# Altium footprint library SMT.PcbLib: 379 footprints (part 21 of 24)
Each footprint in its own frame and in the unit in brackets; x right, y up, seen from the top. Pads: shape width x height; smd on the part's side, far side on the other; paste and mask are expansions set on the pad; w line width, h text height; cw(c..) or ccw(c..) is an arc to the next point about the centre after c.
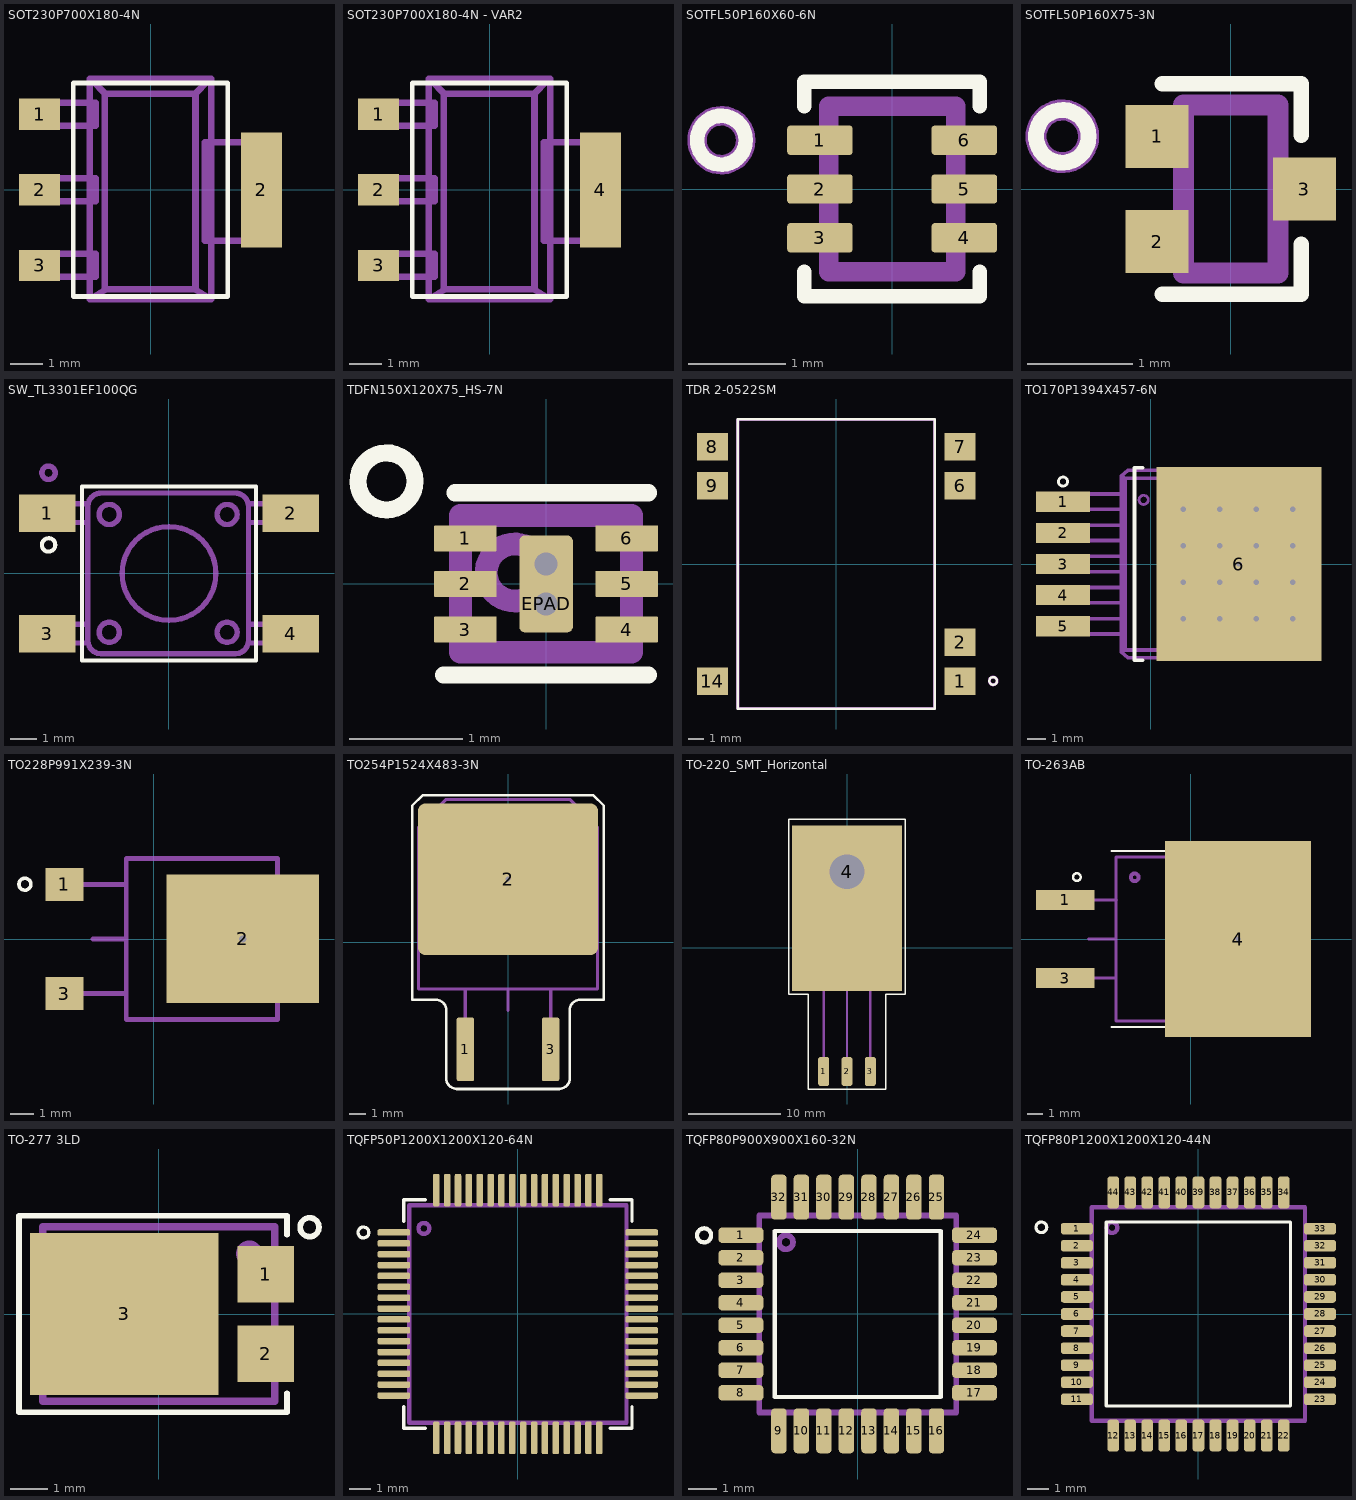
[diagram p20: the footprints below, top view; thin cyan lines are the x and y axes]

## SOT230P700X180-4N [mm] "SOT223, 4-Leads, Body 6,5x7,0mm (max), Pitch 2,30mm, IPC Medium Density"
height 1.8
pads (4):
  rect 1.25x0.95 smd: 1(-3.375,2.3) 2(-3.375,0) 3(-3.375,-2.3)
  rect 1.25x3.5 smd: 2(3.375,0)
Top Overlay:
  lines w0.15: -2.35,-3.25 2.35,-3.25 2.35,3.25 -2.35,3.25 -2.35,-3.25
Mechanical 1:
  lines w0.2: -1.758,3.301 -1.385,2.928 ; -1.35,-3.025 -1.85,-3.325 ; 1.35,-3.025 1.85,-3.325 ; 1.742,3.301 1.369,2.928 ; -1.85,-3.325 1.85,-3.325 ; -1.85,-3.325 -1.85,3.375 1.85,3.375 1.85,-3.325 ; -1.385,2.928 1.369,2.928 ; -1.385,2.928 -1.385,-3.026 1.369,-3.026 1.369,2.928 ; -3.61,-2.649 -3.104,-2.649 -2.812,-2.649 -2.782,-2.649 -2.421,-2.649 -1.672,-2.649 -1.672,-1.949 -2.421,-1.949 -2.782,-1.949 -2.812,-1.949 -3.104,-1.949 -3.61,-1.949 -3.61,-2.649 ; -3.61,-0.349 -3.104,-0.349 -2.812,-0.349 -2.782,-0.349 -2.421,-0.349 -1.672,-0.349 -1.672,0.351 -2.421,0.351 -2.782,0.351 -2.812,0.351 -3.104,0.351 -3.61,0.351 -3.61,-0.349 ; -3.61,1.951 -3.104,1.951 -2.812,1.951 -2.782,1.951 -2.421,1.951 -1.672,1.951 -1.672,2.651 -2.421,2.651 -2.782,2.651 -2.812,2.651 -3.104,2.651 -3.61,2.651 -3.61,1.951 ; 1.656,-1.549 1.656,1.451 2.404,1.451 2.766,1.451 2.796,1.451 3.088,1.451 3.594,1.451 3.594,-1.549 3.088,-1.549 2.796,-1.549 2.766,-1.549 2.404,-1.549 1.656,-1.549
Mechanical 20:
  text "Требуется прошивка, см.pdf" at -8.7,-5.2 h1.8
3D body "User Library-SOT-223-2.STEP": height 1.9, standoff 0, extent -3.61,-3.424 3.594,3.276

## SOT230P700X180-4N - VAR2 [mm] "SOT223, 4-Leads, Body 6,5x7,0mm (max), Pitch 2,30mm, IPC Medium Density"
height 1.8
pads (4):
  rect 1.25x0.95 smd: 1(-3.375,2.3) 2(-3.375,0) 3(-3.375,-2.3)
  rect 1.25x3.5 smd: 4(3.375,0)
Top Overlay:
  lines w0.15: -2.35,-3.25 2.35,-3.25 2.35,3.25 -2.35,3.25 -2.35,-3.25
Mechanical 1:
  lines w0.2: -1.758,3.301 -1.385,2.928 ; -1.35,-3.025 -1.85,-3.325 ; 1.35,-3.025 1.85,-3.325 ; 1.742,3.301 1.369,2.928 ; -1.85,-3.325 -1.85,3.375 1.85,3.375 1.85,-3.325 ; -1.85,-3.325 1.85,-3.325 ; -1.385,2.928 -1.385,-3.026 1.369,-3.026 1.369,2.928 ; -1.385,2.928 1.369,2.928 ; -3.61,-2.649 -3.61,-1.949 -3.104,-1.949 -2.812,-1.949 -2.782,-1.949 -2.421,-1.949 -1.672,-1.949 -1.672,-2.649 -2.421,-2.649 -2.782,-2.649 -2.812,-2.649 -3.104,-2.649 -3.61,-2.649 ; -3.61,-0.349 -3.61,0.351 -3.104,0.351 -2.812,0.351 -2.782,0.351 -2.421,0.351 -1.672,0.351 -1.672,-0.349 -2.421,-0.349 -2.782,-0.349 -2.812,-0.349 -3.104,-0.349 -3.61,-0.349 ; -3.61,1.951 -3.61,2.651 -3.104,2.651 -2.812,2.651 -2.782,2.651 -2.421,2.651 -1.672,2.651 -1.672,1.951 -2.421,1.951 -2.782,1.951 -2.812,1.951 -3.104,1.951 -3.61,1.951 ; 1.656,-1.549 2.404,-1.549 2.766,-1.549 2.796,-1.549 3.088,-1.549 3.594,-1.549 3.594,1.451 3.088,1.451 2.796,1.451 2.766,1.451 2.404,1.451 1.656,1.451 1.656,-1.549
Mechanical 20:
  text "Требуется прошивка, см.pdf" at -8.7,-5.2 h1.8
3D body "User Library-SOT-223-2.STEP": height 1.9, standoff 0, extent -3.61,-3.424 3.594,3.276

## SOTFL50P160X60-6N [mm] "SOTFL, 6-Leads, Body 1,60x1,60mm, Pitch 0,50mm, IPC Medium Density"
height 0.6
pads (6):
  rrect20% 0.67x0.3 smd paste+0 mask+0.05: 1(-0.74,0.5) 2(-0.74,0) 3(-0.74,-0.5) 4(0.74,-0.5) 5(0.74,0) 6(0.74,0.5)
Top Overlay:
  circle w0.15: c-1.75,0.5 r0.25
  lines w0.15: -0.9,-0.85 -0.9,-1.1 0.9,-1.1 0.9,-0.85 ; -0.9,0.85 -0.9,1.1 0.9,1.1 0.9,0.85
Mechanical 1:
  circle w0.2: c-1.75,0.5 r0.25
  lines w0.2: -0.65,-0.85 -0.65,0.85 0.65,0.85 0.65,-0.85 -0.65,-0.85
3D body "SOTFL50P160X60-6N.step": height 0.6, standoff 0, extent -0.8,-0.848 0.8,0.848

## SOTFL50P160X75-3N [mm] "SSMini3-F1, 3-Leads, Body 1.6x0.85mm, Pitch 0.5mm, IPC Medium Density"
height 0.75
pads (3):
  rect 0.6x0.6 smd: 1(-0.7,0.5) 2(-0.7,-0.5) 3(0.7,0)
Top Overlay:
  circle w0.15: c-1.6,0.5 r0.25
  lines w0.15: -0.65,-1 0.67,-1 0.67,-0.527 ; -0.65,1 0.67,1 0.67,0.513
Mechanical 1:
  circle w0.2: c-1.6,0.5 r0.25
  lines w0.2: -0.45,-0.8 0.45,-0.8 0.45,0.8 -0.45,0.8 -0.45,-0.8
3D body "User Library-FDY102PZ.STEP": height 0.78, standoff 0, extent -0.85,-0.85 0.85,0.85

## SW_TL3301EF100QG [mm] "SMT_TL3301EF100QG 6x6x7.3mm"
height 7.3
pads (4):
  rect 2.1x1.4 smd: 1(-4.55,2.25) 2(4.55,2.25) 3(-4.55,-2.25) 4(4.55,-2.25)
Top Overlay:
  circle w0.15: c-4.496,1.067 r0.25
  lines w0.15: -3.25,-3.25 -3.25,3.25 3.25,3.25 3.25,-3.25 -3.25,-3.25
Mechanical 1:
  circle w0.2: c-4.496,3.759 r0.25
  circle w0.2: c0,0 r1.75
  lines w0.2: -3.031,-1.895 -3.423,-1.895 -3.726,-1.895 -4.188,-1.895 -4.231,-1.895 -5.031,-1.895 -5.031,-2.595 -4.231,-2.595 -4.188,-2.595 -3.726,-2.595 -3.423,-2.595 -3.021,-2.595 ; -3.031,1.905 -3.423,1.905 -3.726,1.905 -4.188,1.905 -4.231,1.905 -5.031,1.905 -5.031,2.605 -4.231,2.605 -4.188,2.605 -3.726,2.605 -3.423,2.605 -3.021,2.605 ; 2.959,-2.595 3.361,-2.595 3.664,-2.595 4.126,-2.595 4.169,-2.595 4.969,-2.595 4.969,-1.895 4.169,-1.895 4.126,-1.895 3.664,-1.895 3.361,-1.895 2.969,-1.895 ; 2.959,2.605 3.361,2.605 3.664,2.605 4.126,2.605 4.169,2.605 4.969,2.605 4.969,1.905 4.169,1.905 4.126,1.905 3.664,1.905 3.361,1.905 2.969,1.905 ; -3.031,-2.495 ccw(c-2.531,-2.495) -2.531,-2.995 2.469,-2.995 ccw(c2.469,-2.495) 2.969,-2.495 2.969,2.505 ccw(c2.469,2.505) 2.469,3.005 -2.531,3.005 ccw(c-2.531,2.505) -3.031,2.505 -3.031,-2.495 ; -2.606,-2.195 cw(c-2.231,-2.195) -1.856,-2.195 cw(c-2.231,-2.195) -2.606,-2.195 ; -2.606,2.205 ccw(c-2.231,2.205) -1.856,2.205 ccw(c-2.231,2.205) -2.606,2.205 ; 1.794,-2.195 ccw(c2.169,-2.195) 2.544,-2.195 ccw(c2.169,-2.195) 1.794,-2.195 ; 1.794,2.205 cw(c2.169,2.205) 2.544,2.205 cw(c2.169,2.205) 1.794,2.205
3D body "TL3301SPFxxxxG.stp": height 7.6, standoff 0, extent -5,-3 5,3

## TDFN150X120X75_HS-7N [mm] "6-Leads, Body 1.5X1.2 mm Pitch 0.4 mm, Thermal Pad 0.52X0.85 mm IPC Medium Density"
height 0.8
pads (7):
  rrect9% 0.55x0.23 smd paste+0 mask+0.04: 1(-0.708,0.4) 2(-0.708,0) 3(-0.708,-0.4) 4(0.708,-0.4) 5(0.708,0) 6(0.708,0.4)
  rrect20% 0.47x0.85 hole 0.2 copper offset 0,0.175 mask+0.04: EPAD(0,-0.175)
via 0,0.175 diameter 0.45 hole 0.2
Top Overlay:
  lines w0.15: -1.15,0.9 cw(c-1.4,0.9) -1.15,0.908 ; -0.9,-0.8 0.9,-0.8 ; -0.8,0.8 0.9,0.8
Top Paste:
  region: -0.155,-0.345 -0.155,0.345 0.155,0.345 0.155,-0.345
Mechanical 1:
  circle w0.2: c-0.275,0.1 r0.25
  lines w0.2: -0.75,-0.6 -0.75,0.6 0.75,0.6 0.75,-0.6 -0.75,-0.6
Mechanical 20:
  text "Требуется прошивка / см.datasheet, отв.plugged" at -2.5,-1.7 h1
3D body "МААМ-011101.stp": height 0.75, standoff -0.02, extent -0.75,-0.6 0.75,0.6

## TDR 2-0522SM [mm]
height 8.7
pads (7):
  rect 2x1.8 smd: 1(8.05,-7.62) 2(8.05,-5.08) 6(8.05,5.08) 7(8.05,7.62) 8(-8.05,7.62) 9(-8.05,5.08) 14(-8.05,-7.62)
Top Overlay:
  circle w0.15: c10.2,-7.6 r0.25
  lines w0.15: -6.4,-9.4 6.4,-9.4 6.4,9.4 -6.4,9.4 -6.4,-9.4
Mechanical 1:
  circle w0.2: c10.2,-7.6 r0.25
  lines w0.2: -6.4,-9.4 -6.4,9.4 6.4,9.4 6.4,-9.4 -6.4,-9.4
3D body "TDR 2.stp": height 8.96, standoff 0.01, extent -8.6,-9.42 8.6,9.42

## TO170P1394X457-6N [mm] "D2-PAK, 6-Pads, Body 7,04x8,63mm (max), IPC Medium Density"
height 4.57
pads (6):
  rect 2.95x1.1 smd: 1(-4.8,3.4) 2(-4.8,1.7) 3(-4.8,0) 4(-4.8,-1.7) 5(-4.8,-3.4)
  rect 9x10.6 hole 0.3 paste+9: 6(4.8,0)
via 5.75,3 diameter 0.8 hole 0.3
via 3.75,3 diameter 0.8 hole 0.3
via 1.75,3 diameter 0.8 hole 0.3
via 1.75,1 diameter 0.8 hole 0.3
via 3.75,1 diameter 0.8 hole 0.3
via 5.75,1 diameter 0.8 hole 0.3
via 7.75,3 diameter 0.8 hole 0.3
via 7.75,1 diameter 0.8 hole 0.3
via 1.75,-1 diameter 0.8 hole 0.3
via 3.75,-1 diameter 0.8 hole 0.3
via 5.75,-1 diameter 0.8 hole 0.3
via 7.75,-1 diameter 0.8 hole 0.3
via 7.75,-3 diameter 0.8 hole 0.3
via 5.75,-3 diameter 0.8 hole 0.3
via 3.75,-3 diameter 0.8 hole 0.3
via 1.75,-3 diameter 0.8 hole 0.3
Top Overlay:
  circle w0.15: c-4.8,4.5 r0.25
  lines w0.2: -0.45,-5.25 -0.9,-5.25 -0.9,5.25 -0.45,5.25
Top Paste:
  region: 8.393,3.663 7.093,3.663 7.093,2.363 8.393,2.363
  region: 8.393,1.663 7.093,1.663 7.093,0.363 8.393,0.363
  region: 8.393,-0.337 7.093,-0.337 7.093,-1.637 8.393,-1.637
  region: 8.393,-2.337 7.093,-2.337 7.093,-3.637 8.393,-3.637
  region: 6.393,3.663 5.093,3.663 5.093,2.363 6.393,2.363
  region: 6.393,1.663 5.093,1.663 5.093,0.363 6.393,0.363
  region: 6.393,-0.337 5.093,-0.337 5.093,-1.637 6.393,-1.637
  region: 6.393,-2.337 5.093,-2.337 5.093,-3.637 6.393,-3.637
  region: 4.393,-2.337 3.093,-2.337 3.093,-3.637 4.393,-3.637
  region: 4.393,-0.337 3.093,-0.337 3.093,-1.637 4.393,-1.637
  region: 4.393,1.663 3.093,1.663 3.093,0.363 4.393,0.363
  region: 4.393,3.663 3.093,3.663 3.093,2.363 4.393,2.363
  region: 2.393,3.663 1.093,3.663 1.093,2.363 2.393,2.363
  region: 2.393,1.663 1.093,1.663 1.093,0.363 2.393,0.363
  region: 2.393,-0.337 1.093,-0.337 1.093,-1.637 2.393,-1.637
  region: 2.393,-2.337 1.093,-2.337 1.093,-3.637 2.393,-3.637
Mechanical 1:
  circle w0.15: c-0.4,3.5 r0.25
  lines w0.2: -1.617,-4.812 -1.418,-4.691 ; -1.617,-4.812 -1.617,-3.824 ; -1.617,-4.812 -1.261,-5.113 7.273,-5.113 ; -1.617,-3.824 -1.617,-2.986 ; -1.617,-3.824 -2.462,-3.824 -3.572,-3.824 -3.63,-3.824 -4.284,-3.824 -5.554,-3.824 -5.554,-2.986 -4.284,-2.986 -3.63,-2.986 -3.572,-2.986 -2.462,-2.986 -1.617,-2.986 ; -1.617,-2.986 -1.617,-2.122 ; -1.617,-2.122 -2.462,-2.122 -3.572,-2.122 -3.63,-2.122 -4.284,-2.122 -5.554,-2.122 -5.554,-1.284 -4.284,-1.284 -3.63,-1.284 -3.572,-1.284 -2.462,-1.284 -1.617,-1.284 ; -1.617,-2.122 -1.617,-1.284 ; -1.617,-1.284 -1.617,-0.42 ; -1.617,-0.42 -2.462,-0.42 -3.572,-0.42 -3.63,-0.42 -4.284,-0.42 -5.554,-0.42 -5.554,0.418 -4.284,0.418 -3.63,0.418 -3.572,0.418 -2.462,0.418 -1.617,0.418 ; -1.617,-0.42 -1.617,0.418 ; -1.617,0.418 -1.617,1.282 ; -1.617,1.282 -2.462,1.282 -3.572,1.282 -3.63,1.282 -4.284,1.282 -5.554,1.282 -5.554,2.12 -4.284,2.12 -3.63,2.12 -3.572,2.12 -2.462,2.12 -1.617,2.12 ; -1.617,1.282 -1.617,2.12 ; -1.617,2.12 -1.617,2.984 ; -1.617,2.984 -1.617,3.822 ; -1.617,2.984 -2.462,2.984 -3.572,2.984 -3.63,2.984 -4.284,2.984 -5.554,2.984 -5.554,3.822 -4.284,3.822 -3.63,3.822 -3.572,3.822 -2.462,3.822 -1.617,3.822 ; -1.617,3.822 -1.617,4.81 ; -1.617,4.81 -1.261,5.111 7.273,5.111 ; -1.617,4.81 -1.418,4.689 ; -1.418,-4.691 -1.418,4.689 ; -1.418,-4.691 6.919,-4.691 ; -1.418,4.689 6.919,4.689 ; 6.919,-4.691 6.919,4.689 ; 6.919,-4.691 7.273,-4.99 7.273,-3.252 ; 6.919,4.689 7.273,4.989 7.273,3.25 ; 7.273,-5.113 8.299,-5.113 8.797,-3.252 8.797,3.25 8.299,5.111 7.273,5.111 ; 7.273,-5.113 7.273,-3.252 ; 7.273,-3.252 7.273,3.25 ; 7.273,3.25 7.273,5.111
Mechanical 15:
  lines w0.1: 0.95,0 1.95,0 ; 1.45,-0.5 1.45,0.5
3D body "SW3dPS-LTC DD-PAK.STEP": height 4.4, standoff -0.09, extent -5.882,-5.112 8.469,5.112

## TO228P991X239-3N [mm] "D-PAK, 3-Pads, Body 9.905x6,605mm (max), IPC Medium Density"
height 2.38
pads (3):
  rect 1.6x1.4 smd: 1(-3.746,2.29) 3(-3.746,-2.29)
  rect 6.4x5.4 hole 0.3: 2(3.747,0.004)
Top Overlay:
  circle w0.15: c-5.4,2.3 r0.25
Top Paste:
  region: 5.447,-1.196 5.447,1.204 2.047,1.204 2.047,-1.196
Mechanical 1:
  lines w0.2: -3.683,-2.286 -1.146,-2.286 ; -3.683,2.286 -1.143,2.286 ; -2.54,0 -1.146,0 ; 5.204,-2.25 5.5,-2.25 6,-1.75 6,1.75 5.5,2.25 5.204,2.25 ; -1.146,-3.375 5.204,-3.375 5.204,3.375 -1.146,3.375 -1.146,-3.375
3D body "SW3dPS-DPAK-1.STEP": height 2.41, standoff 0, extent -4.033,-3.27 5.906,3.27

## TO254P1524X483-3N [mm] "SMD; Pitch: 2.54mm; Body: L=14.7 мм, W=10,2 мм, H=4.6 мм"
height 4.572
pads (3):
  rrect25% 1.05x3.8 smd: 1(-2.54,-6.4) 3(2.54,-6.4)
  rrect10% 10.75x9.05 hole 0.3: 2(0,3.75)
Top Overlay:
  lines w0.15: -5.715,-3.429 -4.318,-3.429 cw(c-4.318,-4.064) -3.683,-4.064 -3.683,-8.128 ccw(c-3.048,-8.128) -3.048,-8.763 3.048,-8.763 ccw(c3.048,-8.128) 3.683,-8.128 3.683,-4.064 cw(c4.318,-4.064) 4.318,-3.429 5.715,-3.429 5.715,8.128 5.08,8.763 -5.08,8.763 -5.715,8.128 -5.715,-3.429
Top Paste:
  rectangle: -2.8,1.8 2.9,5.7
Mechanical 1:
  lines w0.2: -2.54,-7.375 -2.54,-2.803 ; 0,-4.073 0,-2.803 ; 2.54,-7.375 2.54,-2.803 ; -5.334,6.849 -3.683,8.5 ; -5.334,6.849 -5.334,-2.803 5.334,-2.803 5.334,6.849 ; -5.334,6.849 5.334,6.849 ; -3.683,8.5 3.683,8.5 ; -3.683,8.5 3.683,8.5 ; 3.683,8.5 5.334,6.849
3D body "D2PAK.STEP": height 4.9, standoff -0.12, extent -5.08,-7.112 5.08,8.152

## TO-220_SMT_Horizontal [mm] "Transistor outline, TO-220, SMT, требуеться прошивка. Формовку выводов см. приспособление ЛБИЮ.7803-0021-000 СБ"
height 4.7
pads (4):
  rrect50% 1.2x3.2 smd: 1(-2.54,-13.462) 2(0,-13.462) 3(2.54,-13.462)
  rect 12x18 hole 3.8 copper offset 0,-3.986: 4(0,8.255)
Top Overlay:
  lines w0.15: -6.35,-5.08 -4.191,-5.08 -4.191,-15.367 4.191,-15.367 4.191,-5.08 6.35,-5.08 6.35,13.97 -6.35,13.97 -6.35,-5.08
Mechanical 1:
  circle w0.2: c0,8.259 r1.9
  lines w0.025: -2.413,8.259 2.413,8.259 ; 0,-4.953 0,12.573
  lines w0.25: -5.334,4.445 5.334,4.445 ; -2.54,-14.478 -2.54,-4.445 ; 0,-14.478 0,-4.445 ; 2.54,-14.478 2.54,-4.445 ; -5.334,-4.445 5.334,-4.445 5.334,11.049 -5.334,11.049 -5.334,-4.445
3D body "TO-220_SMT_Horizontal.STEP": height 4.7, standoff 0, extent -5.27,-14.54 5.27,11.045

## TO-263AB [mm] "D2-PAK, 3-Pads, Body 9.65x10.67mm (max), IPC Medium Density"
height 4.83
pads (3):
  rect 3.8x1.3 smd paste-0.1 mask+0.05: 1(-8.125,2.54) 3(-8.125,-2.54)
  rect 9.45x12.7 hole 0.3 paste-10: 4(3.075,0)
Top Overlay:
  circle w0.15: c-7.375,4.015 r0.25
  lines w0.15: -5.125,-5.7 7.675,-5.7 7.675,5.7 -5.125,5.7
Top Paste:
  rectangle: -0.175,-3.25 2.575,-0.5
  region: 6.325,-0.5 3.575,-0.5 3.575,-3.25 6.325,-3.25
  region: 6.325,3.25 3.575,3.25 3.575,0.5 6.325,0.5
  rectangle: -0.175,0.5 2.575,3.25
Mechanical 1:
  circle w0.25: c-3.625,4 r0.25
  lines w0.2: -9.375,-2.54 -4.825,-2.54 ; -9.358,2.54 -4.808,2.54 ; -6.605,0 -4.825,0 ; 4.825,-5.325 6.105,-5.325 6.505,-4.925 6.505,4.925 6.105,5.325 4.825,5.325 ; 4.825,-5.325 -4.825,-5.325 -4.825,5.325 4.825,5.325 ; 4.825,-5.325 4.825,5.325
3D body "DPAK254P1525X483-3N.step": height 5.23, standoff 0, extent -8.705,-5.325 6.54,5.325

## TO-277 3LD [mm] "TO-277 3LD, 4.63x6.15 (max), 3 lead"
height 1.2
pads (3):
  rect 1.5x1.5 smd: 1(2.837,1.05) 2(2.837,-1.05)
  rect 5x4.3 smd paste-10: 3(-0.913,0)
Top Overlay:
  circle w0.15: c4,2.3 r0.25
  lines w0.15: -3.7,-1.5 -3.7,2.6 3.4,2.6 3.4,2.1 ; -3.7,-1.4 -3.7,-2.6 3.4,-2.6 3.4,-2.1
Top Paste:
  region: -2.7,1.5 0.9,1.5 0.9,-1.5 -2.7,-1.5
Mechanical 1:
  circle w0.2: c2.4,1.6 r0.25
  lines w0.2: -3.075,-2.315 3.075,-2.315 3.075,2.315 -3.075,2.315 -3.075,-2.315
3D body "TO-277.stp": height 1.2, standoff -0.01, extent -3.3,-2.175 3.35,2.175

## TQFP50P1200X1200X120-64N [mm] "TSQFP, 64-Leads, Body 10,00x10,00mm, Pitch 0,50mm, IPC Medium Density"
height 1.2
pads (64):
  rrect50% 1.5x0.3 smd mask+0.03: 1(-5.7,3.75) 2(-5.7,3.25) 3(-5.7,2.75) 4(-5.7,2.25) 5(-5.7,1.75) 6(-5.7,1.25) 7(-5.7,0.75) 8(-5.7,0.25) 9(-5.7,-0.25) 10(-5.7,-0.75) 11(-5.7,-1.25) 12(-5.7,-1.75) 13(-5.7,-2.25) 14(-5.7,-2.75) 15(-5.7,-3.25) 16(-5.7,-3.75) 33(5.7,-3.75) 34(5.7,-3.25) 35(5.7,-2.75) 36(5.7,-2.25) 37(5.7,-1.75) 38(5.7,-1.25) 39(5.7,-0.75) 40(5.7,-0.25) 41(5.7,0.25) 42(5.7,0.75) 43(5.7,1.25) 44(5.7,1.75) 45(5.7,2.25) 46(5.7,2.75) 47(5.7,3.25) 48(5.7,3.75)
  rrect50% 0.3x1.5 smd mask+0.03: 17(-3.75,-5.7) 18(-3.25,-5.7) 19(-2.75,-5.7) 20(-2.25,-5.7) 21(-1.75,-5.7) 22(-1.25,-5.7) 23(-0.75,-5.7) 24(-0.25,-5.7) 25(0.25,-5.7) 26(0.75,-5.7) 27(1.25,-5.7) 28(1.75,-5.7) 29(2.25,-5.7) 30(2.75,-5.7) 31(3.25,-5.7) 32(3.75,-5.7) 49(3.75,5.7) 50(3.25,5.7) 51(2.75,5.7) 52(2.25,5.7) 53(1.75,5.7) 54(1.25,5.7) 55(0.75,5.7) 56(0.25,5.7) 57(-0.25,5.7) 58(-0.75,5.7) 59(-1.25,5.7) 60(-1.75,5.7) 61(-2.25,5.7) 62(-2.75,5.7) 63(-3.25,5.7) 64(-3.75,5.7)
Top Overlay:
  circle w0.15: c-7.1,3.75 r0.25
  lines w0.15: -5.25,-4.25 -5.25,-5.25 -4.25,-5.25 ; -5.25,4.25 -5.25,5.25 -4.25,5.25 ; 4.25,-5.25 5.25,-5.25 5.25,-4.25 ; 4.25,5.25 5.25,5.25 5.25,4.25
Mechanical 1:
  circle w0.2: c-4.318,3.937 r0.25
  lines w0.2: -5,-5 5,-5 5,5 -5,5 -5,-5
3D body "User Library-VQFP-64.STEP": height 1.22, standoff 0, extent -5.999,-6 6,5.999

## TQFP80P900X900X160-32N [mm] "TQFP, 32-Leads, Body 7,00x7,00mm, Pitch 0,80mm, IPC Medium Density"
height 1.6
pads (32):
  rrect50% 1.6x0.55 smd mask+0.03: 1(-4.15,2.8) 2(-4.15,2) 3(-4.15,1.2) 4(-4.15,0.4) 5(-4.15,-0.4) 6(-4.15,-1.2) 7(-4.15,-2) 8(-4.15,-2.8) 17(4.15,-2.8) 18(4.15,-2) 19(4.15,-1.2) 20(4.15,-0.4) 21(4.15,0.4) 22(4.15,1.2) 23(4.15,2) 24(4.15,2.8)
  rrect50% 0.55x1.6 smd mask+0.03: 9(-2.8,-4.15) 10(-2,-4.15) 11(-1.2,-4.15) 12(-0.4,-4.15) 13(0.4,-4.15) 14(1.2,-4.15) 15(2,-4.15) 16(2.8,-4.15) 25(2.8,4.15) 26(2,4.15) 27(1.2,4.15) 28(0.4,4.15) 29(-0.4,4.15) 30(-1.2,4.15) 31(-2,4.15) 32(-2.8,4.15)
Top Overlay:
  circle w0.15: c-5.461,2.794 r0.25
  lines w0.15: -2.95,-2.95 2.95,-2.95 2.95,2.95 -2.95,2.95 -2.95,-2.95
Mechanical 1:
  circle w0.2: c-2.55,2.55 r0.25
  lines w0.2: -3.5,-3.5 3.5,-3.5 3.5,3.5 -3.5,3.5 -3.5,-3.5
Mechanical 3:
  circle w0.2: c-2.55,2.55 r0.25
  lines w0.2: -3.5,-3.5 -3.5,3.5 3.5,3.5 3.5,-3.5 -3.5,-3.5
3D body "TQFP80P900X900-32.STEP": height 1.21, standoff 0.01, extent -4.5,-4.5 4.5,4.5

## TQFP80P1200X1200X120-44N [mm] "TQFP, 44-Leads, Body 10,00x10,00mm, Pitch 0,80mm, IPC Medium Density"
height 1.2
pads (44):
  rrect50% 1.5x0.55 smd mask+0.03: 1(-5.7,4) 2(-5.7,3.2) 3(-5.7,2.4) 4(-5.7,1.6) 5(-5.7,0.8) 6(-5.7,0) 7(-5.7,-0.8) 8(-5.7,-1.6) 9(-5.7,-2.4) 10(-5.7,-3.2) 11(-5.7,-4) 23(5.7,-4) 24(5.7,-3.2) 25(5.7,-2.4) 26(5.7,-1.6) 27(5.7,-0.8) 28(5.7,0) 29(5.7,0.8) 30(5.7,1.6) 31(5.7,2.4) 32(5.7,3.2) 33(5.7,4)
  rrect50% 0.55x1.5 smd mask+0.03: 12(-4,-5.7) 13(-3.2,-5.7) 14(-2.4,-5.7) 15(-1.6,-5.7) 16(-0.8,-5.7) 17(0,-5.7) 18(0.8,-5.7) 19(1.6,-5.7) 20(2.4,-5.7) 21(3.2,-5.7) 22(4,-5.7) 34(4,5.7) 35(3.2,5.7) 36(2.4,5.7) 37(1.6,5.7) 38(0.8,5.7) 39(0,5.7) 40(-0.8,5.7) 41(-1.6,5.7) 42(-2.4,5.7) 43(-3.2,5.7) 44(-4,5.7)
Top Overlay:
  circle w0.15: c-7.366,4.064 r0.25
  lines w0.15: -4.318,-4.318 4.318,-4.318 4.318,4.318 -4.318,4.318 -4.318,-4.318
Mechanical 1:
  circle w0.2: c-4.05,4.05 r0.25
  lines w0.2: -5,-5 5,-5 5,5 -5,5 -5,-5
3D body "SW3dPS-VQFP-44.STEP": height 1.22, standoff -0.1, extent -6.181,-6 5.98,6.002